# Altium footprint library General.PcbLib: 246 footprints (part 6 of 16)
Each footprint in its own frame and in the unit in brackets; x right, y up, seen from the top. Pads: shape width x height; smd on the part's side, far side on the other; paste and mask are expansions set on the pad; w line width, h text height; cw(c..) or ccw(c..) is an arc to the next point about the centre after c.
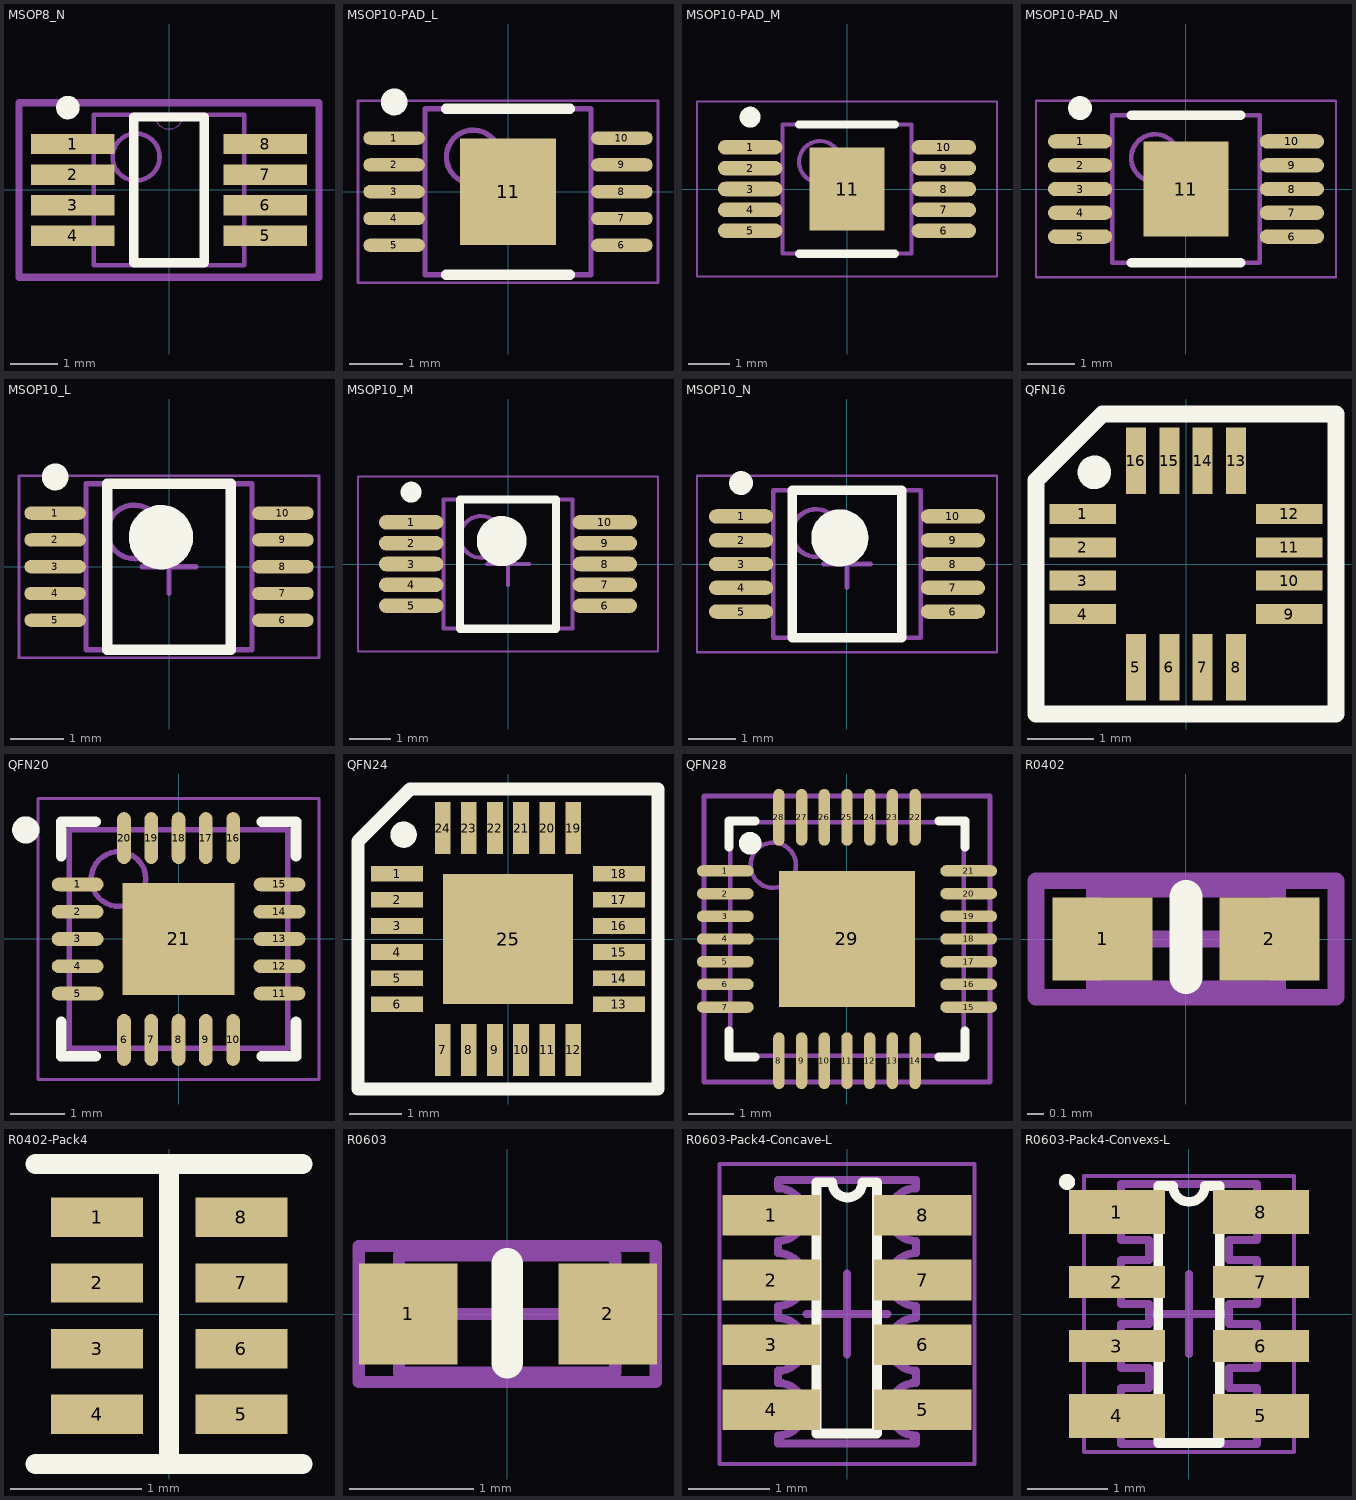
[diagram p5: the footprints below, top view; thin cyan lines are the x and y axes]

## MSOP8_N [mil] "MSOP, 8-Leads, Body 3.00x3.00mm, Pitch 0.65mm, IPC Normal Density"
pads (8):
  rect 70x17 smd mask+4: 1(-80.5,38.39) 2(-80.5,12.8) 3(-80.5,-12.8) 4(-80.5,-38.39) 5(80.5,-38.39) 6(80.5,-12.8) 7(80.5,12.8) 8(80.5,38.39)
Top Overlay:
  circle w9.84: c-84.65,68.9 r4.92
  lines w7.87: -29.53,-61.02 29.53,-61.02 29.53,61.02 -29.53,61.02 -29.53,-61.02
Mechanical 13:
  circle w3.94: c-27.56,27.56 r19.68
  lines w0: -12,63 ccw(c0,63) 12,63
  lines w3.94: -62.99,-62.99 62.99,-62.99 62.99,62.99 -62.99,62.99 -62.99,-62.99
Mechanical 15:
  lines w6: -125.5,-73 -125.5,73 125.5,73 125.5,-73 -125.5,-73
3D body "MSOP8.STEP": height 33.46, standoff -2.95, extent -98.42,-59.06 98.43,59.05

## MSOP10-PAD_L [mm] "MSOP, 10-Leads, Body 3.00x3.00mm, Pitch 0.50mm, Thermal Pad 1.99x1.79mm, IPC High Density"
height 1.1
pads (11):
  oval 1.15x0.25 smd: 1(-2.125,1) 2(-2.125,0.5) 3(-2.125,0) 4(-2.125,-0.5) 5(-2.125,-1) 6(2.125,-1) 7(2.125,-0.5) 8(2.125,0) 9(2.125,0.5) 10(2.125,1)
  rect 1.79x1.99 smd: 11(0,0)
Top Overlay:
  circle w0.25: c-2.125,1.675 r0.125
  lines w0.2: -1.15,-1.55 1.15,-1.55 ; -1.15,1.55 1.15,1.55
Mechanical 13:
  circle w0.1: c-0.65,0.65 r0.5
  lines w0.1: -1.55,-1.55 1.55,-1.55 1.55,1.55 -1.55,1.55 -1.55,-1.55
Mechanical 15:
  lines w0.05: -2.8,-1.7 2.8,-1.7 2.8,1.7 -2.8,1.7 -2.8,-1.7
  lines w0.1: -0.5,0 0.5,0 ; 0,-0.5 0,0.5
3D body "TSSOP50P490X110_HS-11L.step": height 1.1, standoff 0, extent -2.45,-1.55 2.45,1.55

## MSOP10-PAD_M [mm] "MSOP, 10-Leads, Body 3.00x3.00mm, Pitch 0.50mm, Thermal Pad 1.99x1.79mm, IPC Low Density"
height 1.1
pads (11):
  oval 1.55x0.35 smd: 1(-2.325,1) 2(-2.325,0.5) 3(-2.325,0) 4(-2.325,-0.5) 5(-2.325,-1) 6(2.325,-1) 7(2.325,-0.5) 8(2.325,0) 9(2.325,0.5) 10(2.325,1)
  rect 1.79x1.99 smd: 11(0,0)
Top Overlay:
  circle w0.25: c-2.325,1.725 r0.125
  lines w0.2: -1.15,-1.55 1.15,-1.55 ; -1.15,1.55 1.15,1.55
Mechanical 13:
  circle w0.1: c-0.65,0.65 r0.5
  lines w0.1: -1.55,-1.55 -1.55,1.55 1.55,1.55 1.55,-1.55 -1.55,-1.55
Mechanical 15:
  lines w0.05: -3.6,-2.1 -3.6,2.1 3.6,2.1 3.6,-2.1 -3.6,-2.1
  lines w0.1: -0.5,0 0.5,0 ; 0,-0.5 0,0.5
3D body "TSSOP50P490X110_HS-11M.step": height 1.1, standoff 0, extent -2.45,-1.55 2.45,1.55

## MSOP10-PAD_N [mm] "MSOP, 10-Leads, Body 3.00x3.00mm, Pitch 0.50mm, Thermal Pad 1.99x1.79mm, IPC Medium Density"
height 1.1
pads (11):
  oval 1.35x0.3 smd: 1(-2.225,1) 2(-2.225,0.5) 3(-2.225,0) 4(-2.225,-0.5) 5(-2.225,-1) 6(2.225,-1) 7(2.225,-0.5) 8(2.225,0) 9(2.225,0.5) 10(2.225,1)
  rect 1.79x1.99 smd: 11(0,0)
Top Overlay:
  circle w0.25: c-2.225,1.7 r0.125
  lines w0.2: -1.15,-1.55 1.15,-1.55 ; -1.15,1.55 1.15,1.55
Mechanical 13:
  circle w0.1: c-0.65,0.65 r0.5
  lines w0.1: -1.55,-1.55 1.55,-1.55 1.55,1.55 -1.55,1.55 -1.55,-1.55
Mechanical 15:
  lines w0.05: -3.15,-1.85 3.15,-1.85 3.15,1.85 -3.15,1.85 -3.15,-1.85
  lines w0.1: -0.5,0 0.5,0 ; 0,-0.5 0,0.5
3D body "TSSOP50P490X110_HS-11N.step": height 1.1, standoff 0, extent -2.45,-1.55 2.45,1.55

## MSOP10_L [mm] "MSOP, 10-Leads, Body 3.00x3.00mm, Pitch 0.50mm, IPC High Density"
height 1.1
pads (10):
  oval 1.15x0.25 smd: 1(-2.125,1) 2(-2.125,0.5) 3(-2.125,0) 4(-2.125,-0.5) 5(-2.125,-1) 6(2.125,-1) 7(2.125,-0.5) 8(2.125,0) 9(2.125,0.5) 10(2.125,1)
Top Overlay:
  circle w0.6: c-0.15,0.55 r0.3
  circle w0.25: c-2.125,1.675 r0.125
  lines w0.2: -1.15,-1.55 1.15,-1.55 1.15,1.55 -1.15,1.55 -1.15,-1.55
Mechanical 13:
  circle w0.1: c-0.65,0.65 r0.5
  lines w0.1: -1.55,-1.55 1.55,-1.55 1.55,1.55 -1.55,1.55 -1.55,-1.55
Mechanical 15:
  lines w0.05: -2.8,-1.7 2.8,-1.7 2.8,1.7 -2.8,1.7 -2.8,-1.7
  lines w0.1: -0.5,0 0.5,0 ; 0,-0.5 0,0.5
3D body "TSSOP50P490X110-10L.step": height 1.1, standoff 0, extent -2.45,-1.55 2.45,1.55

## MSOP10_M [mm] "MSOP, 10-Leads, Body 3.00x3.00mm, Pitch 0.50mm, IPC Low Density"
height 1.1
pads (10):
  oval 1.55x0.35 smd: 1(-2.325,1) 2(-2.325,0.5) 3(-2.325,0) 4(-2.325,-0.5) 5(-2.325,-1) 6(2.325,-1) 7(2.325,-0.5) 8(2.325,0) 9(2.325,0.5) 10(2.325,1)
Top Overlay:
  circle w0.6: c-0.15,0.55 r0.3
  circle w0.25: c-2.325,1.725 r0.125
  lines w0.2: -1.15,-1.55 1.15,-1.55 1.15,1.55 -1.15,1.55 -1.15,-1.55
Mechanical 13:
  circle w0.1: c-0.65,0.65 r0.5
  lines w0.1: -1.55,-1.55 1.55,-1.55 1.55,1.55 -1.55,1.55 -1.55,-1.55
Mechanical 15:
  lines w0.05: -3.6,-2.1 3.6,-2.1 3.6,2.1 -3.6,2.1 -3.6,-2.1
  lines w0.1: -0.5,0 0.5,0 ; 0,-0.5 0,0.5
3D body "TSSOP50P490X110-10M.step": height 1.1, standoff 0, extent -2.45,-1.55 2.45,1.55

## MSOP10_N [mm] "MSOP, 10-Leads, Body 3.00x3.00mm, Pitch 0.50mm, IPC Medium Density"
height 1.1
pads (10):
  oval 1.35x0.3 smd: 1(-2.225,1) 2(-2.225,0.5) 3(-2.225,0) 4(-2.225,-0.5) 5(-2.225,-1) 6(2.225,-1) 7(2.225,-0.5) 8(2.225,0) 9(2.225,0.5) 10(2.225,1)
Top Overlay:
  circle w0.6: c-0.15,0.55 r0.3
  circle w0.25: c-2.225,1.7 r0.125
  lines w0.2: -1.15,-1.55 1.15,-1.55 1.15,1.55 -1.15,1.55 -1.15,-1.55
Mechanical 13:
  circle w0.1: c-0.65,0.65 r0.5
  lines w0.1: -1.55,-1.55 1.55,-1.55 1.55,1.55 -1.55,1.55 -1.55,-1.55
Mechanical 15:
  lines w0.05: -3.15,-1.85 3.15,-1.85 3.15,1.85 -3.15,1.85 -3.15,-1.85
  lines w0.1: -0.5,0 0.5,0 ; 0,-0.5 0,0.5
3D body "TSSOP50P490X110-10N.step": height 1.1, standoff 0, extent -2.45,-1.55 2.45,1.55

## QFN16 [mm]
height 0.9
pads (16):
  rect 1x0.3 smd: 1(-1.55,0.75) 2(-1.55,0.25) 3(-1.55,-0.25) 4(-1.55,-0.75) 9(1.55,-0.75) 10(1.55,-0.25) 11(1.55,0.25) 12(1.55,0.75)
  rect 0.3x1 smd: 5(-0.75,-1.55) 6(-0.25,-1.55) 7(0.25,-1.55) 8(0.75,-1.55) 13(0.75,1.55) 14(0.25,1.55) 15(-0.25,1.55) 16(-0.75,1.55)
Top Overlay:
  circle w0.254: c-1.375,1.375 r0.125
  lines w0.254: -2.25,-2.25 -2.25,1.25 -1.25,2.25 2.25,2.25 2.25,-2.25 -2.25,-2.25
3D body "User Library-qfn16-3x3.step": height 0.92, standoff 0, extent -1.5,-1.5 1.5,1.5

## QFN20 [mm]
height 0.85
pads (21):
  oval 0.95x0.25 smd: 1(-1.85,1) 2(-1.85,0.5) 3(-1.85,0) 4(-1.85,-0.5) 5(-1.85,-1) 11(1.85,-1) 12(1.85,-0.5) 13(1.85,0) 14(1.85,0.5) 15(1.85,1)
  oval 0.25x0.95 smd: 6(-1,-1.85) 7(-0.5,-1.85) 8(0,-1.85) 9(0.5,-1.85) 10(1,-1.85) 16(1,1.85) 17(0.5,1.85) 18(0,1.85) 19(-0.5,1.85) 20(-1,1.85)
  rect 2.06x2.06 smd: 21(0,0)
Top Overlay:
  circle w0.25: c-2.8,2 r0.125
  lines w0.2: -2.15,-1.525 -2.15,-2.15 -1.525,-2.15 ; -2.15,1.525 -2.15,2.15 -1.525,2.15 ; 1.525,-2.15 2.15,-2.15 2.15,-1.525 ; 1.525,2.15 2.15,2.15 2.15,1.525
Mechanical 13:
  circle w0.1: c-1.1,1.1 r0.5
  lines w0.1: -2,-2 2,-2 2,2 -2,2 -2,-2
Mechanical 15:
  lines w0.05: -2.575,-2.575 2.575,-2.575 2.575,2.575 -2.575,2.575 -2.575,-2.575
  lines w0.1: -0.5,0 0.5,0 ; 0,-0.5 0,0.5
3D body "QFN127P600-8N.step": height 0.85, standoff 0, extent -2.02,-2.02 2.02,2.02

## QFN24 [mm]
pads (25):
  rect 1x0.3 smd: 1(-2.125,1.25) 2(-2.125,0.75) 3(-2.125,0.25) 4(-2.125,-0.25) 5(-2.125,-0.75) 6(-2.125,-1.25) 13(2.125,-1.25) 14(2.125,-0.75) 15(2.125,-0.25) 16(2.125,0.25) 17(2.125,0.75) 18(2.125,1.25)
  rect 0.3x1 smd: 7(-1.25,-2.125) 8(-0.75,-2.125) 9(-0.25,-2.125) 10(0.25,-2.125) 11(0.75,-2.125) 12(1.25,-2.125) 19(1.25,2.125) 20(0.75,2.125) 21(0.25,2.125) 22(-0.25,2.125) 23(-0.75,2.125) 24(-1.25,2.125)
  rect 2.5x2.5 smd: 25(0,0)
Top Overlay:
  circle w0.254: c-2,2 r0.125
  lines w0.254: -2.875,-2.875 2.875,-2.875 2.875,2.875 -1.25,2.875 -1.875,2.875 -2.875,1.875 -2.875,1.25 -2.875,-2.875
3D body "User Library-QFN 24 4x4.step": height 0.9, standoff 0, extent -2.002,-2.002 2.002,2.002

## QFN28 [mm] "QFN, 28-Leads, Body 5.2x5.2mm (max), Pitch 0.50mm, IPC Medium Density"
height 1
pads (29):
  oval 1.25x0.25 smd: 1(-2.679,1.5) 2(-2.679,1) 3(-2.679,0.5) 4(-2.679,0) 5(-2.679,-0.5) 6(-2.679,-1) 7(-2.679,-1.5) 15(2.679,-1.5) 16(2.679,-1) 17(2.679,-0.5) 18(2.679,0) 19(2.679,0.5) 20(2.679,1) 21(2.679,1.5)
  oval 0.25x1.25 smd: 8(-1.5,-2.679) 9(-1,-2.679) 10(-0.5,-2.679) 11(0,-2.679) 12(0.5,-2.679) 13(1,-2.679) 14(1.5,-2.679) 22(1.5,2.679) 23(1,2.679) 24(0.5,2.679) 25(0,2.679) 26(-0.5,2.679) 27(-1,2.679) 28(-1.5,2.679)
  rect 3x3 smd: 29(0,0)
Top Overlay:
  circle w0.25: c-2.134,2.108 r0.125
  lines w0.2: -2.6,-2.025 -2.6,-2.6 -2.025,-2.6 ; -2.6,2.025 -2.6,2.6 -2.025,2.6 ; 2.025,-2.6 2.6,-2.6 2.6,-2.025 ; 2.025,2.6 2.6,2.6 2.6,2.025
Mechanical 13:
  circle w0.1: c-1.625,1.625 r0.5
  lines w0.1: -2.575,-2.575 2.575,-2.575 2.575,2.575 -2.575,2.575 -2.575,-2.575
Mechanical 15:
  lines w0.1: -0.5,0 0.5,0 ; 0,-0.5 0,0.5 ; -3.15,-3.15 3.15,-3.15 3.15,3.15 -3.15,3.15 -3.15,-3.15
3D body "RHD28_3P15X3P15.stp": height 1, standoff 0, extent -2.626,-2.626 2.626,2.626

## R0402 [mm] "Chip Resistor, Body 1.0x0.5mm, IPC High Density"
height 1.3
pads (2):
  rect 0.6x0.5 smd: 1(-0.5,0) 2(0.5,0)
Top Overlay:
  lines w0.2: 0,-0.229 0,0.254
Mechanical 13:
  lines w0.1: -0.55,-0.3 0.55,-0.3 0.55,0.3 -0.55,0.3 -0.55,-0.3
Mechanical 15:
  lines w0.1: -0.3,0 0.3,0 ; 0,-0.3 0,0.3 ; -0.9,-0.35 0.9,-0.35 0.9,0.35 -0.9,0.35 -0.9,-0.35
3D body "User Library-Chip Resistor0402.step": height 0.38, standoff 0, extent -0.5,-0.25 0.5,0.25

## R0402-Pack4 [mm] "排阻 4 0402"
pads (8):
  rect 0.7x0.3 smd: 1(-0.549,0.737) 2(-0.549,0.237) 3(-0.549,-0.263) 4(-0.549,-0.763) 5(0.551,-0.763) 6(0.551,-0.263) 7(0.551,0.237) 8(0.551,0.737)
Top Overlay:
  lines w0.152: -1.016,-1.143 1.016,-1.143 ; -1.016,1.143 1.016,1.143 ; 0,-1.133 0,0 0,1.092
3D body "0402_4.step": height 0.45, standoff 0, extent -0.5,-1.025 0.5,0.975

## R0603 [mm] "Chip Resistor, Body 1.6x0.8mm, IPC High Density"
height 0.914
pads (2):
  rect 0.8x0.813 smd: 1(-0.8,0) 2(0.813,0)
Top Overlay:
  lines w0.254: 0,-0.394 0,0.406
Mechanical 13:
  lines w0.1: -0.875,-0.475 -0.875,0.475 0.875,0.475 0.875,-0.475 -0.875,-0.475
Mechanical 15:
  lines w0.1: -0.475,0 0.475,0 ; 0,-0.475 0,0.475 ; -1.2,-0.55 -1.2,0.55 1.2,0.55 1.2,-0.55 -1.2,-0.55
3D body "User Library-Chip Resistor0603.step": height 0.5, standoff 0, extent -0.8,-0.4 0.8,0.4

## R0603-Pack4-Concave-L [mm] "Chip Array, Concave, 8-Leads, Pitch 0.80mm,  Body 3.20x1.60mm,  IPC Medium Density"
pads (8):
  rect 1.2x0.5 smd: 1(-0.941,1.222) 2(-0.941,0.422) 3(-0.941,-0.378) 4(-0.941,-1.178) 5(0.931,-1.178) 6(0.931,-0.378) 7(0.931,0.422) 8(0.931,1.222)
Top Overlay:
  lines w0.12: -0.381,-1.473 -0.381,1.626 ; -0.381,-1.471 0.366,-1.471 0.366,1.628 0.186,1.628 ; -0.381,1.628 -0.201,1.628 ; -0.186,1.626 ccw(c0,1.626) 0.186,1.626
Mechanical 13:
  lines w0.1: -0.855,-1.597 0.845,-1.597 0.845,-1.497 cw(c0.845,-1.172) 0.845,-0.847 0.845,-0.697 cw(c0.845,-0.372) 0.845,-0.047 0.845,0.103 cw(c0.845,0.428) 0.845,0.753 0.845,0.903 cw(c0.845,1.228) 0.845,1.553 0.845,1.653 -0.855,1.653 -0.855,1.553 cw(c-0.855,1.228) -0.855,0.903 -0.855,0.753 cw(c-0.855,0.428) -0.855,0.103 -0.855,-0.047 cw(c-0.855,-0.372) -0.855,-0.697 -0.855,-0.847 cw(c-0.855,-1.172) -0.855,-1.497 -0.855,-1.597
Mechanical 15:
  lines w0.05: -1.575,-1.847 1.565,-1.847 1.565,1.853 -1.575,1.853 -1.575,-1.847
  lines w0.1: -0.505,0.003 0.495,0.003 ; -0.005,-0.497 -0.005,0.503
3D body "R0603X8-Concave-N.step": height 0.6, standoff 0, extent -0.88,-1.597 0.87,1.653

## R0603-Pack4-Convexs-L [mm] "Chip Array, ConvexS, 8-Leads, Pitch 0.80mm,  Body 3.20x1.60mm,  IPC High Density"
height 0.6
pads (8):
  rect 1.2x0.55 smd: 1(-0.9,1.275) 4(-0.9,-1.275) 5(0.9,-1.275) 8(0.9,1.275)
  rect 1.2x0.4 smd: 2(-0.9,0.4) 3(-0.9,-0.4) 6(0.9,-0.4) 7(0.9,0.4)
Top Overlay:
  circle w0.1: c-1.524,1.651 r0.05
  lines w0.12: -0.201,1.6 -0.386,1.6 -0.386,-1.613 0.384,-1.613 0.384,1.6 0.199,1.6 cw(c0,1.6) -0.199,1.6
Mechanical 13:
  lines w0.1: -0.85,-1.625 0.85,-1.625 0.85,-0.925 0.5,-0.925 0.5,-0.675 0.85,-0.675 0.85,-0.125 0.5,-0.125 0.5,0.125 0.85,0.125 0.85,0.675 0.5,0.675 0.5,0.925 0.85,0.925 0.85,1.625 -0.85,1.625 -0.85,0.925 -0.5,0.925 -0.5,0.675 -0.85,0.675 -0.85,0.125 -0.5,0.125 -0.5,-0.125 -0.85,-0.125 -0.85,-0.675 -0.5,-0.675 -0.5,-0.925 -0.85,-0.925 -0.85,-1.625
Mechanical 15:
  lines w0.05: -1.31,-1.725 1.31,-1.725 1.31,1.725 -1.31,1.725 -1.31,-1.725
  lines w0.1: -0.5,0 0.5,0 ; 0,-0.5 0,0.5
3D body "CAC-80P319X159-8L.step": height 0.6, standoff 0, extent -0.875,-1.625 0.875,1.625